# Altium footprint library 3.22-杂项.PcbLib: 985 footprints (part 2 of 64)
Each footprint in its own frame and in the unit in brackets; x right, y up, seen from the top. Pads: shape width x height; smd on the part's side, far side on the other; paste and mask are expansions set on the pad; w line width, h text height; cw(c..) or ccw(c..) is an arc to the next point about the centre after c.
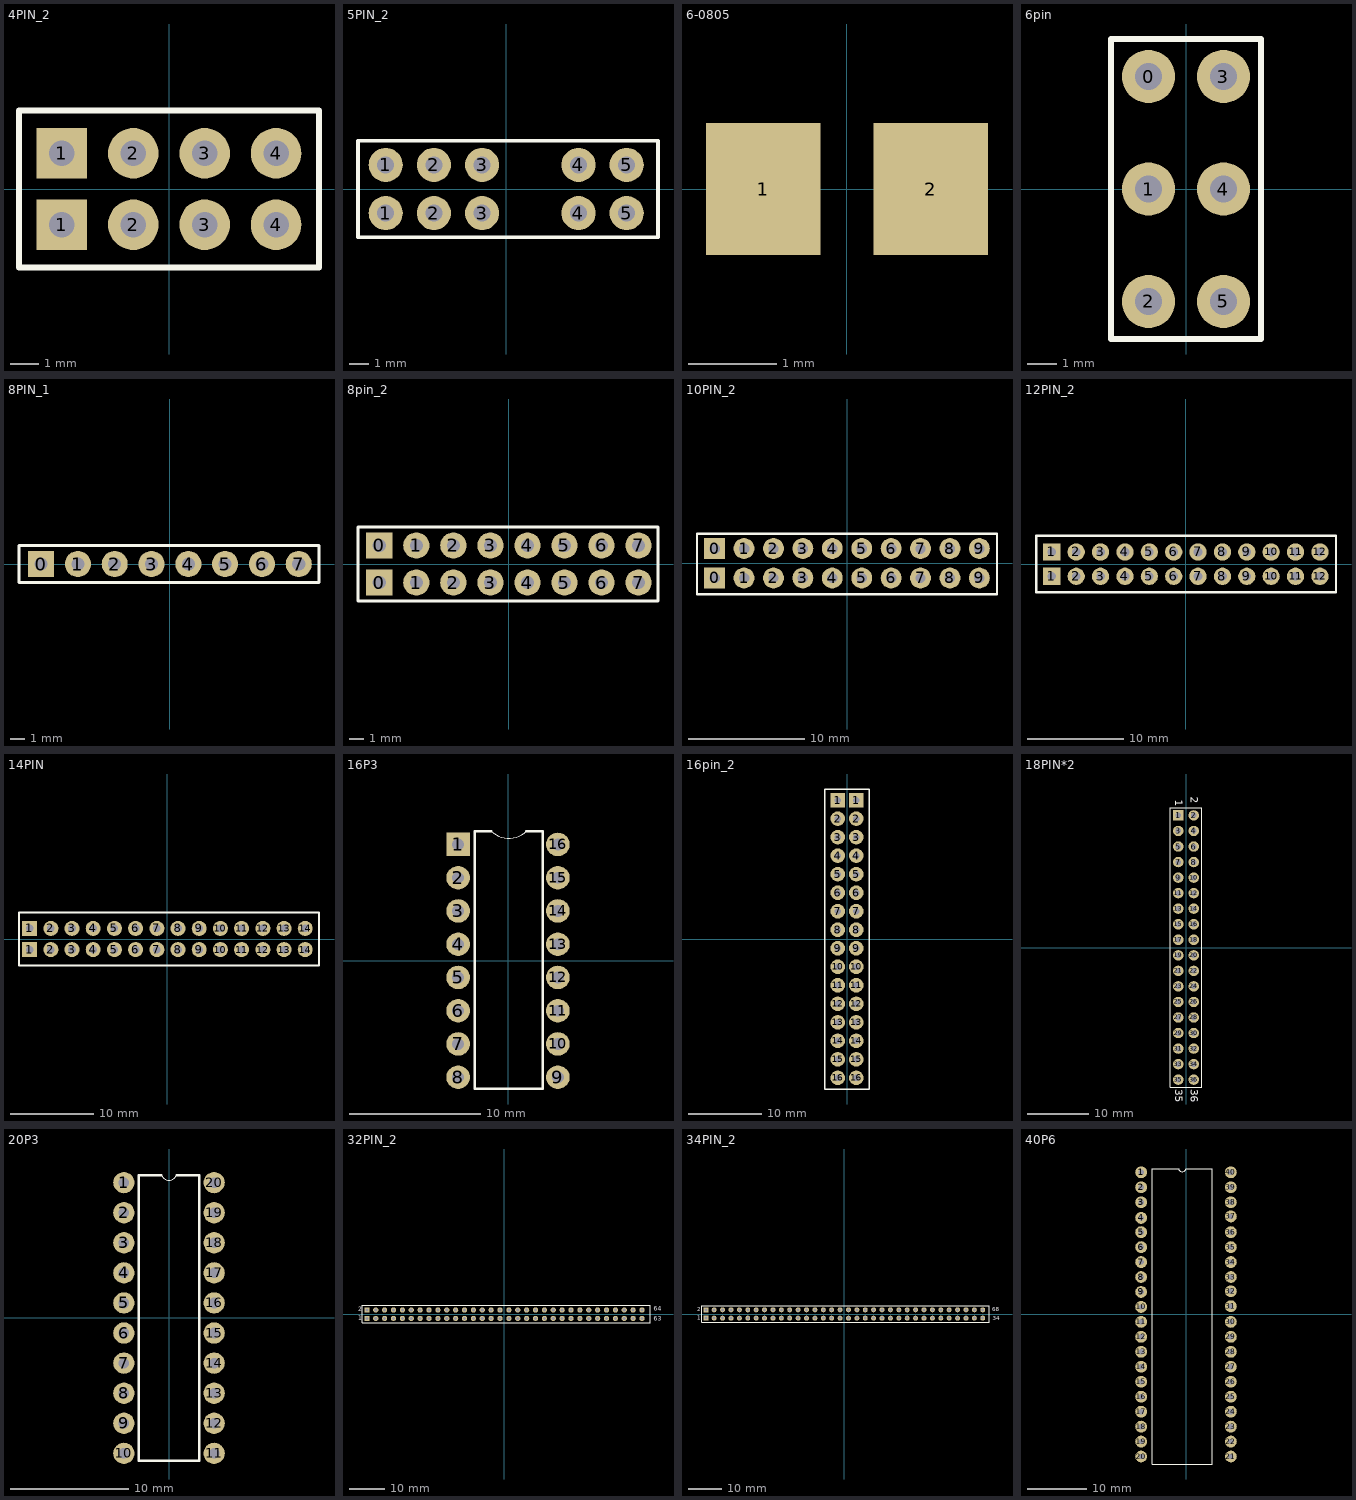
[diagram p1: the footprints below, top view; thin cyan lines are the x and y axes]

## 4PIN_2 [mm]
pads (8):
  rect 1.8x1.8 hole 0.9: 1(-3.81,-1.27) 1(-3.81,1.27)
  round 1.8 hole 0.9: 2(-1.27,-1.27) 2(-1.27,1.27) 3(1.27,-1.27) 3(1.27,1.27) 4(3.81,-1.27) 4(3.81,1.27)
Top Overlay:
  lines w0.203: -5.334,-2.794 -5.334,2.794 5.334,2.794 5.334,-2.794 -5.334,-2.794

## 5PIN_2 [mm]
pads (10):
  round 1.8 hole 0.9: 1(-6.35,-1.27) 1(-6.35,1.27) 2(-3.81,-1.27) 2(-3.81,1.27) 3(-1.27,-1.27) 3(-1.27,1.27) 4(3.81,-1.27) 4(3.81,1.27) 5(6.35,-1.27) 5(6.35,1.27)
Top Overlay:
  lines w0.203: -7.81,-2.54 -7.81,2.54 8.001,2.54 8.001,-2.54 -7.81,-2.54

## 6-0805 [mm] "Chip Resistor; Body 2.0 x 1.3 mm (LxW typ)"
height 0.65
pads (2):
  rect 1.3x1.5 smd: 1(-0.95,0) 2(0.95,0)

## 6pin [mm]
pads (6):
  round 1.8 hole 0.9: 0(-1.27,3.81) 1(-1.27,0) 2(-1.27,-3.81) 3(1.27,3.81) 4(1.27,0) 5(1.27,-3.81)
Top Overlay:
  lines w0.203: -2.54,-5.08 2.54,-5.08 2.54,5.08 -2.54,5.08 -2.54,-5.08

## 8PIN_1 [mm]
pads (8):
  rect 1.8x1.8 hole 0.9: 0(-8.89,0)
  round 1.8 hole 0.9: 1(-6.35,0) 2(-3.81,0) 3(-1.27,0) 4(1.27,0) 5(3.81,0) 6(6.35,0) 7(8.89,0)
Top Overlay:
  lines w0.203: -10.414,1.206 -10.414,-1.27 10.287,-1.27 10.287,1.27 -10.414,1.27

## 8pin_2 [mm]
height 0.381
pads (16):
  rect 1.8x1.8 hole 0.9: 0(-8.89,-1.27) 0(-8.89,1.27)
  round 1.8 hole 0.9: 1(-6.35,-1.27) 1(-6.35,1.27) 2(-3.81,-1.27) 2(-3.81,1.27) 3(-1.27,-1.27) 3(-1.27,1.27) 4(1.27,-1.27) 4(1.27,1.27) 5(3.81,-1.27) 5(3.81,1.27) 6(6.35,-1.27) 6(6.35,1.27) 7(8.89,-1.27) 7(8.89,1.27)
Top Overlay:
  lines w0.203: 10.16,-2.54 -10.351,-2.54 -10.351,2.54 10.16,2.54 ; 10.223,-2.54 10.223,2.54

## 10PIN_2 [mm]
pads (20):
  rect 1.8x1.8 hole 0.9: 0(-11.43,-1.27) 0(-11.43,1.27)
  round 1.8 hole 0.9: 1(-8.89,-1.27) 1(-8.89,1.27) 2(-6.35,-1.27) 2(-6.35,1.27) 3(-3.81,-1.27) 3(-3.81,1.27) 4(-1.27,-1.27) 4(-1.27,1.27) 5(1.27,-1.27) 5(1.27,1.27) 6(3.81,-1.27) 6(3.81,1.27) 7(6.35,-1.27) 7(6.35,1.27) 8(8.89,-1.27) 8(8.89,1.27) 9(11.43,-1.27) 9(11.43,1.27)
Top Overlay:
  lines w0.203: -12.954,-2.667 12.954,-2.667 12.954,2.54 -12.954,2.54 -12.954,-2.667

## 12PIN_2 [mm]
pads (24):
  rect 1.8x1.8 hole 0.9: 1(-13.97,-1.27) 1(-13.97,1.27)
  round 1.8 hole 0.9: 2(-11.43,-1.27) 2(-11.43,1.27) 3(-8.89,-1.27) 3(-8.89,1.27) 4(-6.35,-1.27) 4(-6.35,1.27) 5(-3.81,-1.27) 5(-3.81,1.27) 6(-1.27,-1.27) 6(-1.27,1.27) 7(1.27,-1.27) 7(1.27,1.27) 8(3.81,-1.27) 8(3.81,1.27) 9(6.35,-1.27) 9(6.35,1.27) 10(8.89,-1.27) 10(8.89,1.27) 11(11.43,-1.27) 11(11.43,1.27) 12(13.97,-1.27) 12(13.97,1.27)
Top Overlay:
  lines w0.254: -15.621,-2.921 15.621,-2.921 ; -15.596,-2.921 -15.596,2.946 15.646,2.946 15.646,-2.921

## 14PIN [mm]
pads (28):
  rect 1.8x1.8 hole 0.9: 1(-16.51,-1.27) 1(-16.51,1.27)
  round 1.8 hole 0.9: 2(-13.97,-1.27) 2(-13.97,1.27) 3(-11.43,-1.27) 3(-11.43,1.27) 4(-8.89,-1.27) 4(-8.89,1.27) 5(-6.35,-1.27) 5(-6.35,1.27) 6(-3.81,-1.27) 6(-3.81,1.27) 7(-1.27,-1.27) 7(-1.27,1.27) 8(1.27,-1.27) 8(1.27,1.27) 9(3.81,-1.27) 9(3.81,1.27) 10(6.35,-1.27) 10(6.35,1.27) 11(8.89,-1.27) 11(8.89,1.27) 12(11.43,-1.27) 12(11.43,1.27) 13(13.97,-1.27) 13(13.97,1.27) 14(16.51,-1.27) 14(16.51,1.27)
Top Overlay:
  lines w0.203: 18.034,-3.175 -17.78,-3.175 -17.78,3.175 18.161,3.175 18.161,-3.175

## 16P3 [mm]
pads (16):
  rect 1.8x1.8 hole 0.9: 1(-3.81,8.89)
  round 1.8 hole 0.9: 2(-3.81,6.35) 3(-3.81,3.81) 4(-3.81,1.27) 5(-3.81,-1.27) 6(-3.81,-3.81) 7(-3.81,-6.35) 8(-3.81,-8.89) 9(3.81,-8.89) 10(3.81,-6.35) 11(3.81,-3.81) 12(3.81,-1.27) 13(3.81,1.27) 14(3.81,3.81) 15(3.81,6.35) 16(3.81,8.89)
Top Overlay:
  lines w0.08: -1.27,9.906 ccw(c0.064,11.239) 1.397,9.906
  lines w0.203: -1.27,9.906 -2.54,9.906 -2.54,-9.779 2.667,-9.779 2.667,9.906 1.397,9.906

## 16pin_2 [mm]
pads (32):
  rect 2x2 hole 0.9: 1(-1.27,19.05) 1(1.27,19.05)
  round 2 hole 0.9: 2(-1.27,16.51) 2(1.27,16.51) 3(-1.27,13.97) 3(1.27,13.97) 4(-1.27,11.43) 4(1.27,11.43) 5(-1.27,8.89) 5(1.27,8.89) 6(-1.27,6.35) 6(1.27,6.35) 7(-1.27,3.81) 7(1.27,3.81) 8(-1.27,1.27) 8(1.27,1.27) 9(-1.27,-1.27) 9(1.27,-1.27) 10(-1.27,-3.81) 10(1.27,-3.81) 11(-1.27,-6.35) 11(1.27,-6.35) 12(-1.27,-8.89) 12(1.27,-8.89) 13(-1.27,-11.43) 13(1.27,-11.43) 14(-1.27,-13.97) 14(1.27,-13.97) 15(-1.27,-16.51) 15(1.27,-16.51) 16(-1.27,-19.05) 16(1.27,-19.05)
Top Overlay:
  lines w0.203: -3.048,-20.574 -3.048,20.574 3.048,20.574 3.048,-20.574 -3.048,-20.574

## 18PIN*2 [mm]
pads (36):
  rect 1.7x1.7 hole 0.9: 1(-1.27,21.59)
  round 1.7 hole 0.9: 2(1.27,21.59) 3(-1.27,19.05) 4(1.27,19.05) 5(-1.27,16.51) 6(1.27,16.51) 7(-1.27,13.97) 8(1.27,13.97) 9(-1.27,11.43) 10(1.27,11.43) 11(-1.27,8.89) 12(1.27,8.89) 13(-1.27,6.35) 14(1.27,6.35) 15(-1.27,3.81) 16(1.27,3.81) 17(-1.27,1.27) 18(1.27,1.27) 19(-1.27,-1.27) 20(1.27,-1.27) 21(-1.27,-3.81) 22(1.27,-3.81) 23(-1.27,-6.35) 24(1.27,-6.35) 25(-1.27,-8.89) 26(1.27,-8.89) 27(-1.27,-11.43) 28(1.27,-11.43) 29(-1.27,-13.97) 30(1.27,-13.97) 31(-1.27,-16.51) 32(1.27,-16.51) 33(-1.27,-19.05) 34(1.27,-19.05) 35(-1.27,-21.59) 36(1.27,-21.59)
Top Overlay:
  lines w0.2: -2.54,-22.86 -2.54,22.86 2.54,22.86 2.54,-22.86 -2.54,-22.86
  text "36" at 0.762,-23.114 h1.27
  text "35" at -1.778,-23.114 h1.27
  text "1" at -1.778,24.13 h1.27
  text "2" at 0.762,24.638 h1.27

## 20P3 [mm]
pads (20):
  round 1.8 hole 0.9: 1(-3.81,11.43) 2(-3.81,8.89) 3(-3.81,6.35) 4(-3.81,3.81) 5(-3.81,1.27) 6(-3.81,-1.27) 7(-3.81,-3.81) 8(-3.81,-6.35) 9(-3.81,-8.89) 10(-3.81,-11.43) 11(3.81,-11.43) 12(3.81,-8.89) 13(3.81,-6.35) 14(3.81,-3.81) 15(3.81,-1.27) 16(3.81,1.27) 17(3.81,3.81) 18(3.81,6.35) 19(3.81,8.89) 20(3.81,11.43)
Top Overlay:
  lines w0.076: -0.635,12.065 ccw(c0,12.319) 0.635,12.065
  lines w0.203: -0.635,12.065 -2.54,12.065 -2.54,-12.065 2.54,-12.065 2.54,12.065 0.635,12.065

## 32PIN_2 [mm]
pads (64):
  rect 1.5x1.5 hole 0.9: 1(-39.37,-1.27) 33(-39.37,1.143)
  round 1.5 hole 0.9: 2(-36.83,-1.27) 3(-34.29,-1.27) 4(-31.75,-1.27) 5(-29.21,-1.27) 6(-26.67,-1.27) 7(-24.13,-1.27) 8(-21.59,-1.27) 9(-19.05,-1.27) 10(-16.51,-1.27) 11(-13.97,-1.27) 12(-11.43,-1.27) 13(-8.89,-1.27) 14(-6.35,-1.27) 15(-3.81,-1.27) 16(-1.27,-1.27) 17(1.27,-1.27) 18(3.81,-1.27) 19(6.35,-1.27) 20(8.89,-1.27) 21(11.43,-1.27) 22(13.97,-1.27) 23(16.51,-1.27) 24(19.05,-1.27) 25(21.59,-1.27) 26(24.13,-1.27) 27(26.67,-1.27) 28(29.21,-1.27) 29(31.75,-1.27) 30(34.29,-1.27) 31(36.83,-1.27) 32(39.37,-1.27) 34(-36.83,1.143) 35(-34.29,1.143) 36(-31.75,1.143) 37(-29.21,1.143) 38(-26.67,1.143) 39(-24.13,1.143) 40(-21.59,1.143) 41(-19.05,1.143) 42(-16.51,1.143) 43(-13.97,1.143) 44(-11.43,1.143) 45(-8.89,1.143) 46(-6.35,1.143) 47(-3.81,1.143) 48(-1.27,1.143) 49(1.27,1.143) 50(3.81,1.143) 51(6.35,1.143) 52(8.89,1.143) 53(11.43,1.143) 54(13.97,1.143) 55(16.51,1.143) 56(19.05,1.143) 57(21.59,1.143) 58(24.13,1.143) 59(26.67,1.143) 60(29.21,1.143) 61(31.75,1.143) 62(34.29,1.143) 63(36.83,1.143) 64(39.37,1.143)
Top Overlay:
  lines w0.2: -40.64,-2.54 -40.64,2.54 41.656,2.54 41.656,-2.54 -40.64,-2.54
  text "2" at -41.91,0.762 h1.27
  text "1" at -41.91,-1.778 h1.27
  text "64" at 42.672,0.889 h1.27
  text "63" at 42.672,-1.905 h1.27

## 34PIN_2 [mm]
pads (68):
  rect 1.5x1.5 hole 0.9: 1(-41.91,-1.27) 35(-41.91,1.27)
  round 1.5 hole 0.9: 2(-39.37,-1.27) 3(-36.83,-1.27) 4(-34.29,-1.27) 5(-31.75,-1.27) 6(-29.21,-1.27) 7(-26.67,-1.27) 8(-24.13,-1.27) 9(-21.59,-1.27) 10(-19.05,-1.27) 11(-16.51,-1.27) 12(-13.97,-1.27) 13(-11.43,-1.27) 14(-8.89,-1.27) 15(-6.35,-1.27) 16(-3.81,-1.27) 17(-1.27,-1.27) 18(1.27,-1.27) 19(3.81,-1.27) 20(6.35,-1.27) 21(8.89,-1.27) 22(11.43,-1.27) 23(13.97,-1.27) 24(16.51,-1.27) 25(19.05,-1.27) 26(21.59,-1.27) 27(24.13,-1.27) 28(26.67,-1.27) 29(29.21,-1.27) 30(31.75,-1.27) 31(34.29,-1.27) 32(36.83,-1.27) 33(39.37,-1.27) 34(41.91,-1.27) 36(-39.37,1.27) 37(-36.83,1.27) 38(-34.29,1.27) 39(-31.75,1.27) 40(-29.21,1.27) 41(-26.67,1.27) 42(-24.13,1.27) 43(-21.59,1.27) 44(-19.05,1.27) 45(-16.51,1.27) 46(-13.97,1.27) 47(-11.43,1.27) 48(-8.89,1.27) 49(-6.35,1.27) 50(-3.81,1.27) 51(-1.27,1.27) 52(1.27,1.27) 53(3.81,1.27) 54(6.35,1.27) 55(8.89,1.27) 56(11.43,1.27) 57(13.97,1.27) 58(16.51,1.27) 59(19.05,1.27) 60(21.59,1.27) 61(24.13,1.27) 62(26.67,1.27) 63(29.21,1.27) 64(31.75,1.27) 65(34.29,1.27) 66(36.83,1.27) 67(39.37,1.27) 68(41.91,1.27)
Top Overlay:
  lines w0.2: -43.18,-2.54 43.815,-2.54 43.815,2.54 -43.18,2.54 -43.18,-2.54
  text "34" at 44.958,-1.905 h1.27
  text "68" at 44.831,0.889 h1.27
  text "1" at -44.45,-1.778 h1.27
  text "2" at -44.577,0.762 h1.27

## 40P6 [mm]
pads (40):
  round 2 hole 0.9: 1(-7.62,24.13) 2(-7.62,21.59) 3(-7.62,19.05) 4(-7.62,16.383) 5(-7.62,13.97) 6(-7.62,11.43) 7(-7.62,8.89) 8(-7.62,6.35) 9(-7.62,3.81) 10(-7.62,1.27) 11(-7.62,-1.27) 12(-7.62,-3.81) 13(-7.62,-6.35) 14(-7.62,-8.89) 15(-7.62,-11.43) 16(-7.62,-13.97) 17(-7.62,-16.51) 18(-7.62,-19.05) 19(-7.62,-21.59) 20(-7.62,-24.13) 21(7.62,-24.13) 22(7.62,-21.59) 23(7.62,-19.05) 24(7.62,-16.51) 25(7.62,-13.97) 26(7.62,-11.43) 27(7.62,-8.89) 28(7.62,-6.35) 29(7.62,-3.81) 30(7.62,-1.27) 31(7.62,1.397) 32(7.62,3.937) 33(7.62,6.35) 34(7.62,8.89) 35(7.62,11.43) 36(7.62,13.97) 37(7.62,16.637) 38(7.62,19.05) 39(7.62,21.59) 40(7.62,24.13)
Top Overlay:
  lines w0.076: -1.27,24.765 ccw(c-0.635,24.892) 0,24.765
  lines w0.203: -1.27,24.765 -5.715,24.765 -5.715,-25.4 4.445,-25.4 4.445,24.765 0,24.765